# Altium footprint library ConnectorsTDH.PcbLib: 194 footprints (part 4 of 13)
Each footprint in its own frame and in the unit in brackets; x right, y up, seen from the top. Pads: shape width x height; smd on the part's side, far side on the other; paste and mask are expansions set on the pad; w line width, h text height; cw(c..) or ccw(c..) is an arc to the next point about the centre after c.
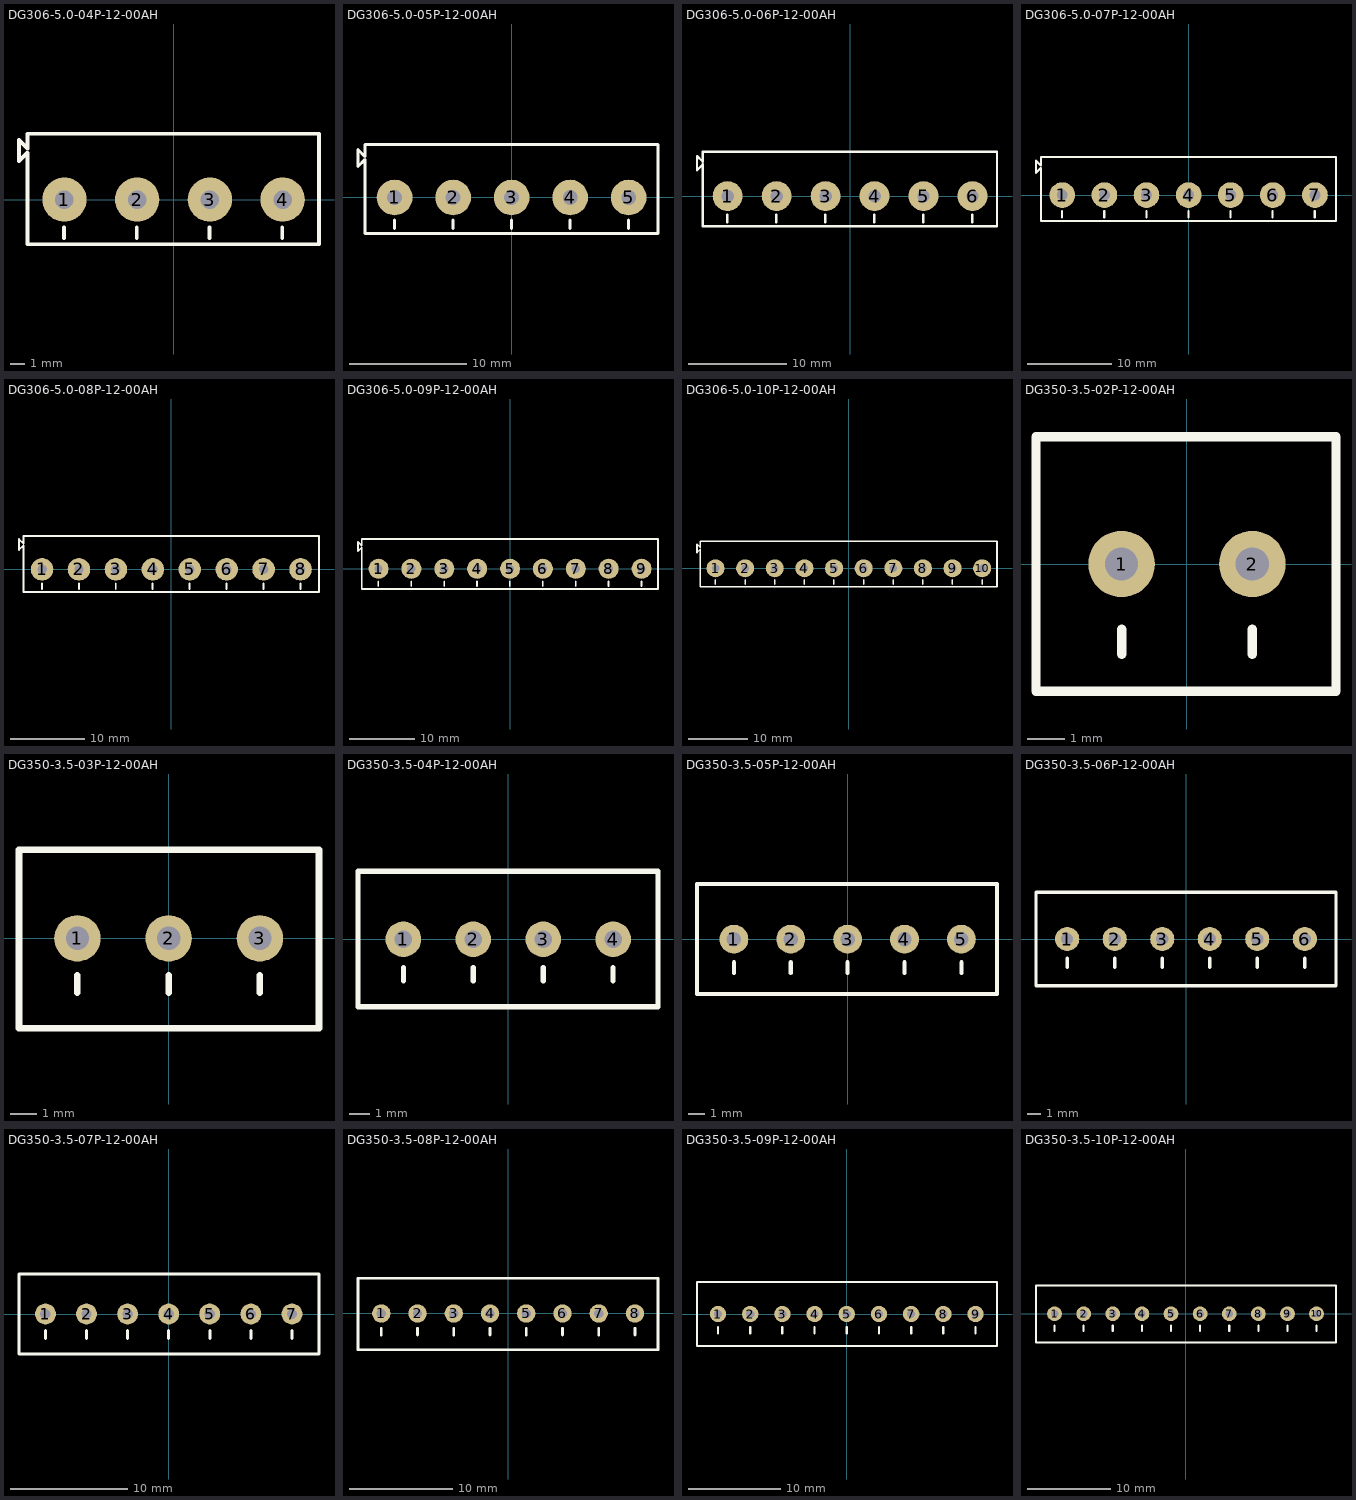
[diagram p3: the footprints below, top view; thin cyan lines are the x and y axes]

## DG306-5.0-04P-12-00AH [mil]
pads (4):
  round 120 hole 50: 1(-295.28,0) 2(-98.43,0) 3(98.43,0) 4(295.28,0)
Top Overlay:
  lines w10: -296.28,-105 -296.28,-75 ; -99.28,-105 -99.28,-75 ; 97.57,-105 97.57,-75 ; 294.43,-105 294.43,-75 ; -418.28,104 -395.28,127 -395.28,-121 393.7,-121 393.7,178 -395.28,178 -395.28,138 -418.28,161 -418.28,104
3D body "DG306-5.0-04P-12-00AH.STEP": height 393.7, standoff -153.47, extent -416.89,-123.21 394.13,176

## DG306-5.0-05P-12-00AH [mil]
pads (5):
  round 120 hole 50: 1(-393.7,0) 2(-196.85,0) 3(0,0) 4(196.85,0) 5(393.7,0)
Top Overlay:
  lines w10: -394.7,-105 -394.7,-75 ; -197.7,-105 -197.7,-75 ; -0.85,-105 -0.85,-75 ; 196,-105 196,-75 ; 392.85,-105 392.85,-75 ; -516.7,104 -493.7,127 -493.7,-121 492.13,-121 492.13,178 -493.7,178 -493.7,138 -516.7,161 -516.7,104
3D body "DG306-5.0-05P-12-00AH.STEP": height 393.7, standoff -153.51, extent -515.32,-123.21 492.56,176

## DG306-5.0-06P-12-00AH [mil]
pads (6):
  round 120 hole 50: 1(-492.13,0) 2(-295.28,0) 3(-98.43,0) 4(98.43,0) 5(295.28,0) 6(492.13,0)
Top Overlay:
  lines w10: -493.13,-105 -493.13,-75 ; -296.13,-105 -296.13,-75 ; -99.28,-105 -99.28,-75 ; 97.57,-105 97.57,-75 ; 294.43,-105 294.43,-75 ; 491.28,-105 491.28,-75 ; -615.13,104 -592.13,127 -592.13,-121 590.55,-121 590.55,178 -592.13,178 -592.13,138 -615.13,161 -615.13,104
3D body "DG306-5.0-06P-12-00AH.STEP": height 393.7, standoff -153.48, extent -613.75,-123.21 590.98,176

## DG306-5.0-07P-12-00AH [mil]
pads (7):
  round 120 hole 50: 1(-590.55,0) 2(-393.7,0) 3(-196.85,0) 4(0,0) 5(196.85,0) 6(393.7,0) 7(590.55,0)
Top Overlay:
  lines w10: -591.55,-105 -591.55,-75 ; -394.55,-105 -394.55,-75 ; -197.7,-105 -197.7,-75 ; -0.85,-105 -0.85,-75 ; 196,-105 196,-75 ; 392.85,-105 392.85,-75 ; 589.7,-105 589.7,-75 ; -713.55,104 -690.55,127 -690.55,-121 688.98,-121 688.98,178 -690.55,178 -690.55,138 -713.55,161 -713.55,104
3D body "DG306-5.0-07P-12-00AH.STEP": height 393.7, standoff -153.52, extent -712.17,-123.21 689.4,176

## DG306-5.0-08P-12-00AH [mil]
pads (8):
  round 120 hole 50: 1(-688.98,0) 2(-492.13,0) 3(-295.28,0) 4(-98.43,0) 5(98.43,0) 6(295.28,0) 7(492.13,0) 8(688.98,0)
Top Overlay:
  lines w10: -689.98,-105 -689.98,-75 ; -492.98,-105 -492.98,-75 ; -296.13,-105 -296.13,-75 ; -99.28,-105 -99.28,-75 ; 97.57,-105 97.57,-75 ; 294.43,-105 294.43,-75 ; 491.28,-105 491.28,-75 ; 688.13,-105 688.13,-75 ; -811.98,104 -811.98,161 -788.98,138 -788.98,178 787.4,178 787.4,-121 -788.98,-121 -788.98,127 -811.98,104
3D body "DG306-5.0-08P-12-00AH.STEP": height 393.7, standoff -153.46, extent -810.6,-123.21 787.83,176

## DG306-5.0-09P-12-00AH [mil]
pads (9):
  round 120 hole 50: 1(-787.4,0) 2(-590.55,0) 3(-393.7,0) 4(-196.85,0) 5(0,0) 6(196.85,0) 7(393.7,0) 8(590.55,0) 9(787.4,0)
Top Overlay:
  lines w10: -788.4,-105 -788.4,-75 ; -591.4,-105 -591.4,-75 ; -394.55,-105 -394.55,-75 ; -197.7,-105 -197.7,-75 ; -0.85,-105 -0.85,-75 ; 196,-105 196,-75 ; 392.85,-105 392.85,-75 ; 589.7,-105 589.7,-75 ; 786.55,-105 786.55,-75 ; -910.4,104 -887.4,127 -887.4,-121 885.83,-121 885.83,178 -887.4,178 -887.4,138 -910.4,161 -910.4,104
3D body "DG306-5.0-09P-12-00AH.STEP": height 393.7, standoff -153.54, extent -909.02,-123.21 886.26,176

## DG306-5.0-10P-12-00AH [mil]
pads (10):
  round 120 hole 50: 1(-885.83,0) 2(-688.98,0) 3(-492.13,0) 4(-295.28,0) 5(-98.43,0) 6(98.43,0) 7(295.28,0) 8(492.13,0) 9(688.98,0) 10(885.83,0)
Top Overlay:
  lines w10: -886.83,-105 -886.83,-75 ; -689.83,-105 -689.83,-75 ; -492.98,-105 -492.98,-75 ; -296.13,-105 -296.13,-75 ; -99.28,-105 -99.28,-75 ; 97.57,-105 97.57,-75 ; 294.43,-105 294.43,-75 ; 491.28,-105 491.28,-75 ; 688.13,-105 688.13,-75 ; 884.98,-105 884.98,-75 ; -1008.83,104 -1008.83,161 -985.83,138 -985.83,178 984.25,178 984.25,-121 -985.83,-121 -985.83,127 -1008.83,104
3D body "DG306-5.0-10P-12-00AH.STEP": height 393.7, standoff -153.54, extent -1007.45,-123.21 984.68,176

## DG350-3.5-02P-12-00AH [mil]
pads (2):
  round 70 hole 35: 1(-68.9,0) 2(68.9,0)
Top Overlay:
  lines w10: -68.9,-94.9 -68.9,-68.9 ; 68.9,-94.9 68.9,-68.9 ; -159,-134 157,-134 157,134 -159,134 -159,-134
3D body "DG350-3.5-02P-12-00AH.STEP": height 330.71, standoff -137.8, extent -157.48,-133.71 157.48,134

## DG350-3.5-03P-12-00AH [mil]
pads (3):
  round 70 hole 35: 1(-137.8,0) 2(0,0) 3(137.8,0)
Top Overlay:
  lines w10: -137.8,-81.9 -137.8,-55.9 ; 0,-81.9 0,-55.9 ; 137.8,-81.9 137.8,-55.9 ; -226,-136 227,-136 227,134 -226,134 -226,-136
3D body "DG350-3.5-03P-12-00AH.STEP": height 330.71, standoff -137.8, extent -226.38,-133.71 226.38,134

## DG350-3.5-04P-12-00AH [mil]
pads (4):
  round 70 hole 35: 1(-206.69,0) 2(-68.9,0) 3(68.9,0) 4(206.69,0)
Top Overlay:
  lines w10: -206.69,-81.9 -206.69,-55.9 ; -68.9,-81.9 -68.9,-55.9 ; 68.9,-81.9 68.9,-55.9 ; 206.69,-81.9 206.69,-55.9 ; -296,-133 295,-133 295,134 -296,134 -296,-133
3D body "DG350-3.5-04P-12-00AH.STEP": height 330.71, standoff -137.8, extent -295.28,-133.71 295.27,134

## DG350-3.5-05P-12-00AH [mil]
pads (5):
  round 70 hole 35: 1(-275.59,0) 2(-137.8,0) 3(0,0) 4(137.8,0) 5(275.59,0)
Top Overlay:
  lines w10: -275.59,-81.9 -275.59,-55.9 ; -137.8,-81.9 -137.8,-55.9 ; 0,-81.9 0,-55.9 ; 137.8,-81.9 137.8,-55.9 ; 275.59,-81.9 275.59,-55.9 ; -365,-133 362,-133 362,134 -365,134 -365,-133
3D body "DG350-3.5-05P-12-00AH.STEP": height 330.71, standoff -137.8, extent -364.17,-133.71 364.18,134

## DG350-3.5-06P-12-00AH [mil]
pads (6):
  round 70 hole 35: 1(-344.49,0) 2(-206.69,0) 3(-68.9,0) 4(68.9,0) 5(206.69,0) 6(344.49,0)
Top Overlay:
  lines w10: -344.49,-81.9 -344.49,-55.9 ; -206.69,-81.9 -206.69,-55.9 ; -68.9,-81.9 -68.9,-55.9 ; 68.9,-81.9 68.9,-55.9 ; 206.69,-81.9 206.69,-55.9 ; 344.49,-81.9 344.49,-55.9 ; -435,-135 435,-135 435,135 -435,135 -435,-135
3D body "DG350-3.5-06P-12-00AH.STEP": height 330.71, standoff -137.8, extent -433.07,-133.71 433.07,134

## DG350-3.5-07P-12-00AH [mil]
pads (7):
  round 70 hole 35: 1(-413.39,0) 2(-275.59,0) 3(-137.8,0) 4(0,0) 5(137.8,0) 6(275.59,0) 7(413.39,0)
Top Overlay:
  lines w10: -413.39,-81.9 -413.39,-55.9 ; -275.59,-81.9 -275.59,-55.9 ; -137.8,-81.9 -137.8,-55.9 ; 0,-81.9 0,-55.9 ; 137.8,-81.9 137.8,-55.9 ; 275.59,-81.9 275.59,-55.9 ; 413.39,-81.9 413.39,-55.9 ; -502,-134 504,-134 504,134 -502,134 -502,-134
3D body "DG350-3.5-07P-12-00AH.STEP": height 330.71, standoff -137.8, extent -501.97,-133.71 501.97,134

## DG350-3.5-08P-12-00AH [mil]
pads (8):
  round 70 hole 35: 1(-482.28,0) 2(-344.49,0) 3(-206.69,0) 4(-68.9,0) 5(68.9,0) 6(206.69,0) 7(344.49,0) 8(482.28,0)
Top Overlay:
  lines w10: -482.28,-81.9 -482.28,-55.9 ; -344.49,-81.9 -344.49,-55.9 ; -206.69,-81.9 -206.69,-55.9 ; -68.9,-81.9 -68.9,-55.9 ; 68.9,-81.9 68.9,-55.9 ; 206.69,-81.9 206.69,-55.9 ; 344.49,-81.9 344.49,-55.9 ; 482.28,-81.9 482.28,-55.9 ; -571,-138 570,-138 570,134 -571,134 -571,-138
3D body "DG350-3.5-08P-12-00AH.STEP": height 330.71, standoff -137.8, extent -570.87,-133.71 570.87,134

## DG350-3.5-09P-12-00AH [mil]
pads (9):
  round 70 hole 35: 1(-551.18,0) 2(-413.39,0) 3(-275.59,0) 4(-137.8,0) 5(0,0) 6(137.8,0) 7(275.59,0) 8(413.39,0) 9(551.18,0)
Top Overlay:
  lines w10: -551.18,-81.9 -551.18,-55.9 ; -413.39,-81.9 -413.39,-55.9 ; -275.59,-81.9 -275.59,-55.9 ; -137.8,-81.9 -137.8,-55.9 ; 0,-81.9 0,-55.9 ; 137.8,-81.9 137.8,-55.9 ; 275.59,-81.9 275.59,-55.9 ; 413.39,-81.9 413.39,-55.9 ; 551.18,-81.9 551.18,-55.9 ; -641,-137 643,-137 643,137 -641,137 -641,-137
3D body "DG350-3.5-09P-12-00AH.STEP": height 330.71, standoff -137.8, extent -639.76,-133.71 639.77,134

## DG350-3.5-10P-12-00AH [mil]
pads (10):
  round 70 hole 35: 1(-620.08,0) 2(-482.28,0) 3(-344.49,0) 4(-206.69,0) 5(-68.9,0) 6(68.9,0) 7(206.69,0) 8(344.49,0) 9(482.28,0) 10(620.08,0)
Top Overlay:
  lines w10: -620.08,-81.9 -620.08,-55.9 ; -482.28,-81.9 -482.28,-55.9 ; -344.49,-81.9 -344.49,-55.9 ; -206.69,-81.9 -206.69,-55.9 ; -68.9,-81.9 -68.9,-55.9 ; 68.9,-81.9 68.9,-55.9 ; 206.69,-81.9 206.69,-55.9 ; 344.49,-81.9 344.49,-55.9 ; 482.28,-81.9 482.28,-55.9 ; 620.08,-81.9 620.08,-55.9 ; -708,-136 712,-136 712,134 -708,134 -708,-136
3D body "DG350-3.5-10P-12-00AH.STEP": height 330.71, standoff -137.8, extent -708.66,-133.71 708.66,134